# Altium footprint library ERNI THD.PcbLib: 27 footprints (part 2 of 3) (continued)
## ERNI_374047 [mm] "55 Signal Contacts in 5 Rows + 11 Ground Shield in 1 Rows, (66 Contacts in 6 Rows a,b,c,d,e,f of 11 positions), Pitch 2 mm,  Press-Fit, Ermet Hard Metric Type C Right Angle Female Connector" (continued)
  text "PCB EDGE" at 7.03,-5.3 h1.2
Mechanical 14:
  lines w0.1: 5.7,-13.95 5.7,-10.95 14.7,-10.95 ; 5.7,-12.4 12.85,-12.15 14.8,-12.15 16.35,-13.7 16.35,-13.95 -6.1,-13.95 -6.1,10.95 14.7,10.95 14.7,-12.15 ; 13.7,-10.95 13.7,10.95 ; 14.3,-10.95 14.3,10.95 ; 15.025,-13.95 15.025,-12.375 ; 8.75,-10.4 8.75,-9.6 12.75,-9.6 12.75,-10.4 8.75,-10.4 ; 8.75,9.6 12.75,9.6 12.75,10.4 8.75,10.4 8.75,9.6
  text "1" at -6.975,9.8 h1.2
  text "11" at -6.975,-10.783 h1.2
  text "f" at -6.363,11.5 h1.5
  text "e" at -4.333,11.667 h1.5
  text "d" at -2.333,11.625 h1.5
  text "c" at -0.333,11.667 h1.5
  text "b" at 1.567,11.65 h1.5
  text "a" at 3.492,11.642 h1.5
Drill Drawing:
  lines w0.1: -6.975,-8.925 -6.975,-11 5.225,-11 5.225,10.95 -6.975,10.95 -6.975,8.875
  text "diam. 0.6mm +/-0.05" at -7.1,-8.25 h1
  text "PRESS-FIT TECHNOLOGY" at -8.9,-8.275 h1
3D body "ERNI_374047.stp": height 8.15, standoff -4.1, extent -6.11,-13.95 16.35,10.95

## ERNI_374543 [mm] "Connector; DIN 41612, Type C, Thru-Hole; Rows a+b+c, 96 Position; Right Angle"
height 11
pads (98):
  round 1.7 hole 1: a1(0,0) a2(0,-2.54) a3(0,-5.08) a4(0,-7.62) a5(0,-10.16) a6(0,-12.7) a7(0,-15.24) a8(0,-17.78) a9(0,-20.32) a10(0,-22.86) a11(0,-25.4) a12(0,-27.94) a13(0,-30.48) a14(0,-33.02) a15(0,-35.56) a16(0,-38.1) a17(0,-40.64) a18(0,-43.18) a19(0,-45.72) a20(0,-48.26) a21(0,-50.8) a22(0,-53.34) a23(0,-55.88) a24(0,-58.42) a25(0,-60.96) a26(0,-63.5) a27(0,-66.04) a28(0,-68.58) a29(0,-71.12) a30(0,-73.66) a31(0,-76.2) a32(0,-78.74) b1(-2.54,0) b2(-2.54,-2.54) b3(-2.54,-5.08) b4(-2.54,-7.62) b5(-2.54,-10.16) b6(-2.54,-12.7) b7(-2.54,-15.24) b8(-2.54,-17.78) b9(-2.54,-20.32) b10(-2.54,-22.86) b11(-2.54,-25.4) b12(-2.54,-27.94) b13(-2.54,-30.48) b14(-2.54,-33.02) b15(-2.54,-35.56) b16(-2.54,-38.1) b17(-2.54,-40.64) b18(-2.54,-43.18) b19(-2.54,-45.72) b20(-2.54,-48.26) b21(-2.54,-50.8) b22(-2.54,-53.34) b23(-2.54,-55.88) b24(-2.54,-58.42) b25(-2.54,-60.96) b26(-2.54,-63.5) b27(-2.54,-66.04) b28(-2.54,-68.58) b29(-2.54,-71.12) b30(-2.54,-73.66) b31(-2.54,-76.2) b32(-2.54,-78.74) c1(-5.08,0) c2(-5.08,-2.54) c3(-5.08,-5.08) c4(-5.08,-7.62) c5(-5.08,-10.16) c6(-5.08,-12.7) c7(-5.08,-15.24) c8(-5.08,-17.78) c9(-5.08,-20.32) c10(-5.08,-22.86) c11(-5.08,-25.4) c12(-5.08,-27.94) c13(-5.08,-30.48) c14(-5.08,-33.02) c15(-5.08,-35.56) c16(-5.08,-38.1) c17(-5.08,-40.64) c18(-5.08,-43.18) c19(-5.08,-45.72) c20(-5.08,-48.26) c21(-5.08,-50.8) c22(-5.08,-53.34) c23(-5.08,-55.88) c24(-5.08,-58.42) c25(-5.08,-60.96) c26(-5.08,-63.5) c27(-5.08,-66.04) c28(-5.08,-68.58) c29(-5.08,-71.12) c30(-5.08,-73.66) c31(-5.08,-76.2) c32(-5.08,-78.74)
  round 3.5 / inner round 3.5 / far side round 5.1 hole 2.8: MTG1(2.54,5.08) MTG2(2.54,-83.82)
Top Overlay:
  lines w0.2: 0.24,-81.431 0.24,-81.67 -0.01,-81.92 -0.01,-86.37 5.29,-86.37 5.29,-83.12 ; 0.24,2.691 0.24,2.93 -0.01,3.18 -0.01,7.63 5.29,7.63 5.29,4.38 ; 0.94,-81.431 0.94,-81.67 1.1,-81.83 ccw(c1.171,-81.76) 1.214,-81.85 1.79,-81.58 1.79,-75.18 ; 0.94,2.691 0.94,2.93 1.1,3.09 cw(c1.171,3.02) 1.214,3.11 1.79,2.84 1.79,-3.56 ; 1.79,-81.22 4.193,-81.22 5.29,-83.12 ; 1.79,-74.68 1.79,-70.1 ; 1.79,-69.6 1.79,-65.02 ; 1.79,-64.52 1.79,-59.94 ; 1.79,-59.44 1.79,-54.86 ; 1.79,-54.36 1.79,-49.78 ; 1.79,-49.28 1.79,-44.7 ; 1.79,-44.2 1.79,-39.62 ; 1.79,-39.12 1.79,-34.54 ; 1.79,-34.04 1.79,-29.46 ; 1.79,-28.96 1.79,-24.38 ; 1.79,-23.88 1.79,-19.3 ; 1.79,-18.8 1.79,-14.22 ; 1.79,-13.72 1.79,-9.14 ; 1.79,-8.64 1.79,-4.071 ; 1.79,2.48 4.193,2.48 5.29,4.38 ; 5.34,-83.12 5.34,4.38 ; 5.34,-75.18 1.483,-75.18 cw(c1.05,-74.93) 1.483,-74.68 5.34,-74.68 ; 5.34,-70.1 1.483,-70.1 cw(c1.05,-69.85) 1.483,-69.6 5.34,-69.6 ; 5.34,-65.02 1.483,-65.02 cw(c1.05,-64.77) 1.483,-64.52 5.34,-64.52 ; 5.34,-59.94 1.483,-59.94 cw(c1.05,-59.69) 1.483,-59.44 5.34,-59.44 ; 5.34,-54.86 1.483,-54.86 cw(c1.05,-54.61) 1.483,-54.36 5.34,-54.36 ; 5.34,-49.78 1.483,-49.78 cw(c1.05,-49.53) 1.483,-49.28 5.34,-49.28 ; 5.34,-44.7 1.483,-44.7 cw(c1.05,-44.45) 1.483,-44.2 5.34,-44.2 ; 5.34,-39.62 1.483,-39.62 cw(c1.05,-39.37) 1.483,-39.12 5.34,-39.12 ; 5.34,-34.54 1.483,-34.54 cw(c1.05,-34.29) 1.483,-34.04 5.34,-34.04 ; 5.34,-29.46 1.483,-29.46 cw(c1.05,-29.21) 1.483,-28.96 5.34,-28.96 ; 5.34,-24.38 1.483,-24.38 cw(c1.05,-24.13) 1.483,-23.88 5.34,-23.88 ; 5.34,-19.3 1.483,-19.3 cw(c1.05,-19.05) 1.483,-18.8 5.34,-18.8 ; 5.34,-14.22 1.483,-14.22 cw(c1.05,-13.97) 1.483,-13.72 5.34,-13.72 ; 5.34,-9.14 1.483,-9.14 cw(c1.05,-8.89) 1.483,-8.64 5.34,-8.64 ; 5.34,-4.06 1.483,-4.06 cw(c1.05,-3.81) 1.483,-3.56 5.34,-3.56 ; 5.29,-83.12 12.69,-83.12 12.69,-65.8 12.09,-65.8 12.09,-61.2 12.69,-61.2 12.69,-50.56 12.09,-50.56 12.09,-45.96 12.69,-45.96 12.69,-32.78 12.09,-32.78 12.09,-28.18 12.69,-28.18 12.69,-17.54 12.09,-17.54 12.09,-12.94 12.69,-12.94 12.69,4.38 5.29,4.38 ; 0.39,-81.46 cw(c0.39,-81.06) 0.39,-80.66 0.79,-80.66 cw(c0.79,-81.06) 0.79,-81.46 0.39,-81.46 ; 0.39,1.92 cw(c0.39,2.32) 0.39,2.72 0.79,2.72 cw(c0.79,2.32) 0.79,1.92 0.39,1.92
  text "30" at -8.57,-74.31 h1.2
  text "25" at -8.57,-61.61 h1.2
  text "20" at -8.57,-48.91 h1.2
  text "15" at -8.47,-36.11 h1.2
  text "10" at -8.495,-23.51 h1.2
  text "5" at -7.445,-10.86 h1.2
  text "32" at -8.57,-79.39 h1.2
  text "1" at -7.045,-0.55 h1.2
  text "c" at -4.9,2.025 h1.2
  text "b" at -2.75,2.08 h1.2
  text "a" at -1.175,2.05 h1.2
Mechanical 8:
  drawing of 396 lines, arcs and shapes, not listed
  text "PCB" at 5.08,-41.275 h1.2
Mechanical 14:
  drawing of 276 lines, arcs and shapes, not listed
  text "a" at -1.175,2.05 h1.2
  text "b" at -2.75,2.08 h1.2
  text "c" at -4.9,2.025 h1.2
  text "30" at -8.57,-74.31 h1.2
  text "25" at -8.57,-61.61 h1.2
  text "20" at -8.57,-48.91 h1.2
  text "15" at -8.47,-36.11 h1.2
  text "10" at -8.495,-23.51 h1.2
  text "5" at -7.445,-10.86 h1.2
  text "32" at -8.57,-79.39 h1.2
  text "1" at -7.045,-0.55 h1.2
  text "c" at -4.445,-0.635 h1.2
  text "a" at 0.635,-0.635 h1.2
3D body "ERNI_374543.stp": height 9.35, standoff -2.87, extent -5.38,-86.37 12.69,7.63

## ERNI_384270 [mm] "DIN 41612, Type 2B, Thru-Hole Pressfit Terminations;  Rows a+b, 32 Positions, Performance Class 2, Lead 3 mm, Pitch 2.54mm, Right Angle Male Connector"
height 8.6
pads (34):
  round 1.7 hole 1: a1(0,0) a2(0,-2.54) a3(0,-5.08) a4(0,-7.62) a5(0,-10.16) a6(0,-12.7) a7(0,-15.24) a8(0,-17.78) a9(0,-20.32) a10(0,-22.86) a11(0,-25.4) a12(0,-27.94) a13(0,-30.48) a14(0,-33.02) a15(0,-35.56) a16(0,-38.1) b1(-2.54,0) b2(-2.54,-2.54) b3(-2.54,-5.08) b4(-2.54,-7.62) b5(-2.54,-10.16) b6(-2.54,-12.7) b7(-2.54,-15.24) b8(-2.54,-17.78) b9(-2.54,-20.32) b10(-2.54,-22.86) b11(-2.54,-25.4) b12(-2.54,-27.94) b13(-2.54,-30.48) b14(-2.54,-33.02) b15(-2.54,-35.56) b16(-2.54,-38.1)
  round 3.5 / inner round 3.5 / far side round 5.1 hole 2.8: MTG1(2.54,5.08) MTG2(2.54,-43.18)
Top Overlay:
  lines w0.2: 2.04,-40.18 -0.36,-40.18 -0.36,-46.05 7.69,-46.05 7.69,-42.5 ; 2.04,2.08 -0.36,2.08 -0.36,7.95 7.69,7.95 7.69,4.4 ; 4.32,-41.15 3.847,-40.33 2.04,-40.33 2.04,2.23 3.847,2.23 4.32,3.05 ; 5.3,-42.5 12.64,-42.5 12.64,4.4 5.3,4.4
  text "15" at -5.58,-36.235 h1.2
  text "1" at -4.255,-0.725 h1.2
  text "b" at -2.56,1.87 h1.2
  text "a" at -1.12,1.87 h1.2
  text "5" at -4.255,-10.885 h1.2
  text "10" at -5.58,-23.535 h1.2
Mechanical 8:
  drawing of 209 lines, arcs and shapes, not listed
  text "PCB EDGE" at 4.85,-22.8 h1.2
Mechanical 14:
  circle w0.1: c2.54,-43.18 r1.25
  circle w0.1: c2.54,5.08 r1.25
  lines w0.1: 2.04,-40.18 -0.36,-40.18 -0.36,-46.05 7.69,-46.05 7.69,-42.5 ; 2.04,2.08 -0.36,2.08 -0.36,7.95 7.69,7.95 7.69,4.4 ; 2.04,-40.33 2.04,2.23 3.847,2.23 5.1,4.4 12.64,4.4 12.64,-42.5 5.1,-42.5 3.847,-40.33 2.04,-40.33
  text "15" at -5.58,-36.235 h1.2
  text "10" at -5.58,-23.535 h1.2
  text "1" at -4.255,-0.725 h1.2
  text "5" at -4.255,-10.885 h1.2
Drill Drawing:
  lines w0.1: -3.9,-40.33 -3.9,2.08 1.4,2.08 1.4,-40.33 -3.9,-40.33
  text "PRESS-FIT TECHNOLOGY diam. 1mm +0.09 -0.06" at 3,-37.1 h1
3D body "ERNI_384270.stp": height 6.83, standoff -3, extent -2.79,-46.05 12.64,7.95

## ERNI_384576 [mm] "DIN 41612, Type C/2, Thru-Hole;  Rows a+b+c, 48 Positions, Lead 3.0 mm, Pitch 2.54mm, Right Angle Male Connector"
height 11
pads (50):
  round 1.7 hole 1: a1(0,0) a2(0,-2.54) a3(0,-5.08) a4(0,-7.62) a5(0,-10.16) a6(0,-12.7) a7(0,-15.24) a8(0,-17.78) a9(0,-20.32) a10(0,-22.86) a11(0,-25.4) a12(0,-27.94) a13(0,-30.48) a14(0,-33.02) a15(0,-35.56) a16(0,-38.1) b1(-2.54,0) b2(-2.54,-2.54) b3(-2.54,-5.08) b4(-2.54,-7.62) b5(-2.54,-10.16) b6(-2.54,-12.7) b7(-2.54,-15.24) b8(-2.54,-17.78) b9(-2.54,-20.32) b10(-2.54,-22.86) b11(-2.54,-25.4) b12(-2.54,-27.94) b13(-2.54,-30.48) b14(-2.54,-33.02) b15(-2.54,-35.56) b16(-2.54,-38.1) c1(-5.08,0) c2(-5.08,-2.54) c3(-5.08,-5.08) c4(-5.08,-7.62) c5(-5.08,-10.16) c6(-5.08,-12.7) c7(-5.08,-15.24) c8(-5.08,-17.78) c9(-5.08,-20.32) c10(-5.08,-22.86) c11(-5.08,-25.4) c12(-5.08,-27.94) c13(-5.08,-30.48) c14(-5.08,-33.02) c15(-5.08,-35.56) c16(-5.08,-38.1)
  round 3.5 / inner round 3.5 / far side round 5.1 hole 2.8: MTG1(2.54,5.08) MTG2(2.54,-43.18)
Top Overlay:
  lines w0.2: 0.265,-40.8 cw(c0.39,-40.42) 0.39,-40.02 0.79,-40.02 cw(c0.79,-40.42) 0.915,-40.8 ; 0.265,2.7 ccw(c0.39,2.32) 0.39,1.92 0.79,1.92 ccw(c0.79,2.32) 0.915,2.7 ; 1.787,-23.88 1.79,-19.311 ; 1.79,-40.65 4.193,-40.65 5.29,-42.55 ; 1.79,-39.78 5.24,-39.78 5.24,1.68 1.79,1.68 ; 1.79,-34.54 1.79,-41.01 1.214,-41.28 cw(c1.171,-41.19) 1.1,-41.26 0.94,-41.1 0.94,-40.8 0.24,-40.8 0.24,-41.1 -0.01,-41.35 -0.01,-45.8 5.29,-45.8 5.29,-42.55 ; 1.79,-34.04 1.79,-29.46 ; 1.79,-28.96 1.79,-24.391 ; 1.79,-18.8 1.79,-14.22 ; 1.79,-13.72 1.79,-9.151 ; 1.79,-8.64 1.79,-4.06 ; 1.79,-3.56 1.79,2.91 1.214,3.18 ccw(c1.171,3.09) 1.1,3.16 0.94,3 0.94,2.7 0.24,2.7 0.24,3.004 -0.01,3.25 -0.01,7.7 5.29,7.7 5.29,4.45 ; 1.79,2.55 4.193,2.55 5.29,4.45 ; 5.24,-34.54 1.483,-34.54 cw(c1.05,-34.29) 1.483,-34.04 5.24,-34.04 ; 5.24,-29.46 1.483,-29.46 cw(c1.05,-29.21) 1.483,-28.96 5.24,-28.96 ; 5.24,-24.38 1.483,-24.38 cw(c1.05,-24.13) 1.483,-23.88 5.24,-23.88 ; 5.24,-19.3 1.483,-19.3 cw(c1.05,-19.05) 1.483,-18.8 5.24,-18.8 ; 5.24,-14.22 1.483,-14.22 cw(c1.05,-13.97) 1.483,-13.72 5.24,-13.72 ; 5.24,-9.14 1.483,-9.14 cw(c1.05,-8.89) 1.483,-8.64 5.24,-8.64 ; 5.24,-4.06 1.483,-4.06 cw(c1.05,-3.81) 1.483,-3.56 5.24,-3.56 ; 5.29,-42.55 12.69,-42.55 12.69,-36.59 12.09,-36.59 12.09,-31.99 12.69,-31.99 12.69,-21.35 12.09,-21.35 12.09,-16.75 12.69,-16.75 12.69,-6.11 12.09,-6.11 12.09,-1.51 12.69,-1.51 12.69,4.45 5.29,4.45
Mechanical 8:
  drawing of 202 lines, arcs and shapes, not listed
Mechanical 14:
  circle w0.1: c2.54,5.08 r1.25
  circle w0.1: c2.54,-43.18 r1.25
  lines w0.1: 0,-38.1 0,0 ; 0.265,-40.8 cw(c0.39,-40.42) 0.39,-40.02 0.79,-40.02 cw(c0.79,-40.42) 0.915,-40.8 ; 0.265,2.7 ccw(c0.39,2.32) 0.39,1.92 0.79,1.92 ccw(c0.79,2.32) 0.915,2.7 ; 1.787,-23.88 1.79,-19.311 ; 1.79,-40.65 4.193,-40.65 5.29,-42.55 ; 1.79,-39.78 5.24,-39.78 5.24,1.68 1.79,1.68 ; 1.79,-38.55 -5.38,-38.55 -5.38,-37.65 1.79,-37.65 ; 1.79,-36.01 -5.38,-36.01 -5.38,-35.11 1.79,-35.11 ; 1.79,-34.54 1.79,-41.01 1.214,-41.28 cw(c1.171,-41.19) 1.1,-41.26 0.94,-41.1 0.94,-40.8 0.24,-40.8 0.24,-41.1 -0.01,-41.35 -0.01,-45.8 5.29,-45.8 5.29,-42.55 ; 1.79,-34.04 1.79,-29.46 ; 1.79,-33.47 -5.38,-33.47 -5.38,-32.57 1.79,-32.57 ; 1.79,-30.93 -5.38,-30.93 -5.38,-30.03 1.79,-30.03 ; 1.79,-28.96 1.79,-24.391 ; 1.79,-28.39 -5.38,-28.39 -5.38,-27.49 1.79,-27.49 ; 1.79,-25.85 -5.38,-25.85 -5.38,-24.95 1.79,-24.95 ; 1.79,-23.31 -5.38,-23.31 -5.38,-22.41 1.79,-22.41 ; 1.79,-20.77 -5.38,-20.77 -5.38,-19.87 1.79,-19.87 ; 1.79,-18.8 1.79,-14.22 ; 1.79,-18.23 -5.38,-18.23 -5.38,-17.33 1.79,-17.33 ; 1.79,-15.69 -5.38,-15.69 -5.38,-14.79 1.79,-14.79 ; 1.79,-13.72 1.79,-9.151 ; 1.79,-13.15 -5.38,-13.15 -5.38,-12.25 1.79,-12.25 ; 1.79,-10.61 -5.38,-10.61 -5.38,-9.71 1.79,-9.71 ; 1.79,-8.64 1.79,-4.06 ; 1.79,-8.07 -5.38,-8.07 -5.38,-7.17 1.79,-7.17 ; 1.79,-5.53 -5.38,-5.53 -5.38,-4.63 1.79,-4.63 ; 1.79,-3.56 1.79,2.91 1.214,3.18 ccw(c1.171,3.09) 1.1,3.16 0.94,3 0.94,2.7 0.24,2.7 0.24,3.004 -0.01,3.25 -0.01,7.7 5.29,7.7 5.29,4.45 ; 1.79,-2.99 -5.38,-2.99 -5.38,-2.09 1.79,-2.09 ; 1.79,-0.45 -5.38,-0.45 -5.38,0.45 1.79,0.45 ; 1.79,2.55 4.193,2.55 5.29,4.45 ; 5.24,-34.54 1.483,-34.54 cw(c1.05,-34.29) 1.483,-34.04 5.24,-34.04 ; 5.24,-29.46 1.483,-29.46 cw(c1.05,-29.21) 1.483,-28.96 5.24,-28.96 ; 5.24,-24.38 1.483,-24.38 cw(c1.05,-24.13) 1.483,-23.88 5.24,-23.88 ; 5.24,-19.3 1.483,-19.3 cw(c1.05,-19.05) 1.483,-18.8 5.24,-18.8 ; 5.24,-14.22 1.483,-14.22 cw(c1.05,-13.97) 1.483,-13.72 5.24,-13.72 ; 5.24,-9.14 1.483,-9.14 cw(c1.05,-8.89) 1.483,-8.64 5.24,-8.64 ; 5.24,-4.06 1.483,-4.06 cw(c1.05,-3.81) 1.483,-3.56 5.24,-3.56 ; 5.29,-42.55 12.69,-42.55 12.69,-36.59 12.09,-36.59 12.09,-31.99 12.69,-31.99 12.69,-21.35 12.09,-21.35 12.09,-16.75 12.69,-16.75 12.69,-6.11 12.09,-6.11 12.09,-1.51 12.69,-1.51 12.69,4.45 5.29,4.45
3D body "ERNI_384576.stp": height 9.35, standoff -2.87, extent -5.38,-45.8 12.69,7.7

## ERNI_454530 [mm] "120 Contacts (10x3 Pairs Signal Contacts + 6x10 Ground Contacts), Pitch 2.5mm,  Press-Fit, Right Angle ERmet ZDplus High Speed Differential Hard Metric Female Connector"
height 16.9
pads (120):
  round 0.95 hole 0.45: a1(5.7,11.238) a2(5.7,8.738) a3(5.7,6.238) a4(5.7,3.738) a5(5.7,1.238) a6(5.7,-1.262) a7(5.7,-3.762) a8(5.7,-6.262) a9(5.7,-8.762) a10(5.7,-11.262) b1(4.5,11.238) b2(4.5,8.738) b3(4.5,6.238) b4(4.5,3.738) b5(4.5,1.238) b6(4.5,-1.262) b7(4.5,-3.762) b8(4.5,-6.262) b9(4.5,-8.762) b10(4.5,-11.262) c1(1.2,11.238) c2(1.2,8.738) c3(1.2,6.238) c4(1.2,3.738) c5(1.2,1.238) c6(1.2,-1.262) c7(1.2,-3.762) c8(1.2,-6.262) c9(1.2,-8.762) c10(1.2,-11.262) d1(0,11.238) d2(0,8.738) d3(0,6.238) d4(0,3.738) d5(0,1.238) d6(0,-1.262) d7(0,-3.762) d8(0,-6.262) d9(0,-8.762) d10(0,-11.262) e1(-3.3,11.238) e2(-3.3,8.738) e3(-3.3,6.238) e4(-3.3,3.738) e5(-3.3,1.238) e6(-3.3,-1.262) e7(-3.3,-3.762) e8(-3.3,-6.262) e9(-3.3,-8.762) e10(-3.3,-11.262) f1(-4.5,11.238) f2(-4.5,8.738) f3(-4.5,6.238) f4(-4.5,3.738) f5(-4.5,1.238) f6(-4.5,-1.262) f7(-4.5,-3.762) f8(-4.5,-6.262) f9(-4.5,-8.762) f10(-4.5,-11.262) Ga1(6.8,10.198) Ga2(6.8,7.698) Ga3(6.8,5.198) Ga4(6.8,2.698) Ga5(6.8,0.198) Ga6(6.8,-2.302) Ga7(6.8,-4.802) Ga8(6.8,-7.302) Ga9(6.8,-9.803) Ga10(6.8,-12.303) Gb1(3.3,11.238) Gb2(3.3,8.738) Gb3(3.3,6.238) Gb4(3.3,3.738) Gb5(3.3,1.238) Gb6(3.3,-1.262) Gb7(3.3,-3.762) Gb8(3.3,-6.262) Gb9(3.3,-8.762) Gb10(3.3,-11.262) Gc1(2.4,11.238) Gc2(2.4,8.738) Gc3(2.4,6.238) Gc4(2.4,3.738) Gc5(2.4,1.238) Gc6(2.4,-1.262) Gc7(2.4,-3.762) Gc8(2.4,-6.262) Gc9(2.4,-8.762) Gc10(2.4,-11.262) Gd1(-1.2,11.238) Gd2(-1.2,8.738) Gd3(-1.2,6.238) Gd4(-1.2,3.738) Gd5(-1.2,1.238) Gd6(-1.2,-1.262) Gd7(-1.2,-3.762) Gd8(-1.2,-6.262) Gd9(-1.2,-8.762) Gd10(-1.2,-11.262) Ge1(-2.1,11.238) Ge2(-2.1,8.738) Ge3(-2.1,6.238) Ge4(-2.1,3.738) Ge5(-2.1,1.238) Ge6(-2.1,-1.262) Ge7(-2.1,-3.762) Ge8(-2.1,-6.262) Ge9(-2.1,-8.762) Ge10(-2.1,-11.262) Gf1(-5.7,11.238) Gf2(-5.7,8.738) Gf3(-5.7,6.238) Gf4(-5.7,3.738) Gf5(-5.7,1.238) Gf6(-5.7,-1.262) Gf7(-5.7,-3.762) Gf8(-5.7,-6.262) Gf9(-5.7,-8.762) Gf10(-5.7,-11.262)
Top Overlay:
  lines w0.2: -6.2,-11.919 -6.2,-12.962 6.305,-12.962 ; -6.2,-10.606 -6.2,-9.419 ; -6.2,-8.106 -6.2,-6.919 ; -6.2,-5.606 -6.2,-4.419 ; -6.2,-3.106 -6.2,-1.919 ; -6.2,-0.606 -6.2,0.581 ; -6.2,1.894 -6.2,3.081 ; -6.2,4.394 -6.2,5.581 ; -6.2,6.894 -6.2,8.081 ; -6.2,9.394 -6.2,10.581 ; -6.2,11.894 -6.2,11.987 -6.044,11.987 ; -5.356,11.987 -4.844,11.987 ; -4.156,11.987 -3.644,11.987 ; -2.956,11.987 -2.444,11.987 ; -0.856,11.987 -0.344,11.987 ; 0.344,11.987 0.856,11.987 ; 1.544,11.987 2.056,11.987 ; 3.644,11.987 4.156,11.987 ; 4.844,11.987 5.356,11.987 ; 6.044,11.987 17.2,11.987 17.2,6.488 ; 7.295,-12.962 17.2,-12.962 17.2,-7.512 ; 14.402,-6.592 15.7,-6.592 ; 14.402,-4.593 15.7,-4.593 ; 14.402,-4.094 15.7,-4.092 15.7,-7.093 14.402,-7.093 14.402,-4.092 ; 14.402,3.407 15.7,3.407 ; 14.402,5.407 15.7,5.407 ; 14.402,5.906 15.7,5.907 15.7,2.907 14.402,2.907 14.402,5.908 ; 17.2,-10.012 18.2,-9.012 18.2,-7.013 17.95,-6.763 ; 17.2,8.988 18.2,7.987 18.2,5.987 17.95,5.737 ; 17.2,-7.512 18.2,-6.512 18.2,-4.513 17.2,-3.512 ; 17.2,-7.512 15.2,-7.512 12.9,-7.392 12.9,-3.633 15.2,-3.512 17.2,-3.512 ; 17.2,-3.512 17.2,2.488 ; 17.2,2.488 15.2,2.488 12.9,2.608 12.9,6.367 15.2,6.488 17.2,6.488 ; 17.2,2.488 18.2,3.487 18.2,5.487 17.2,6.488 ; 16.7,3.988 16.7,4.988 17.4,4.988 17.4,3.988 16.7,3.988
  text "a" at 8.325,-12.2 h1.2
  text "1" at -7.35,10.675 h1.2
  text "10" at -8.75,-11.875 h1.2
Mechanical 8:
  drawing of 488 lines, arcs and shapes, not listed
  text "PCB EDGE" at 9.23,-4.975 h1.2
  text "Ga" at 7.107,8.299 h1
  text "a" at 6.007,9.713 h1
  text "b" at 4.807,9.713 h1
  text "Gb" at 3.607,9.339 h1
  text "Gc" at 2.707,9.407 h1
  text "c" at 1.507,9.8 h1
  text "d" at 0.307,9.75 h1
  text "Gd" at -0.893,9.357 h1
  text "Ge" at -1.793,9.357 h1
  text "e" at -2.993,9.747 h1
  text "f" at -3.865,9.781 h1
  text "Gf" at -5.065,9.407 h1
  text "10" at 7.984,-10.518 h1.2
  text "1" at 7.984,11.562 h1.2
Mechanical 14:
  lines w0.1: -3,-12.962 -3,11.987 ; -2.7,-12.962 -2.7,11.987 ; 7.3,-12.962 7.3,11.987 ; 14.402,-6.592 15.7,-6.592 ; 14.402,-4.593 15.7,-4.593 ; 14.402,-4.094 15.7,-4.092 15.7,-7.093 14.402,-7.093 14.402,-4.092 ; 14.402,3.407 15.7,3.407 ; 14.402,5.407 15.7,5.407 ; 14.402,5.906 15.7,5.907 15.7,2.907 14.402,2.907 14.402,5.908 ; 17.2,-10.012 18.2,-9.012 18.2,-7.013 17.95,-6.763 ; 17.2,8.988 18.2,7.987 18.2,5.987 17.95,5.737 ; 17.2,-7.512 17.2,-12.962 -6.2,-12.962 -6.2,11.987 17.2,11.987 17.2,6.488 ; 17.2,-7.512 18.2,-6.512 18.2,-4.513 17.2,-3.512 ; 17.2,-7.512 15.2,-7.512 12.9,-7.392 12.9,-3.633 15.2,-3.512 17.2,-3.512 ; 17.2,-3.512 17.2,2.488 ; 17.2,2.488 15.2,2.488 12.9,2.608 12.9,6.367 15.2,6.488 17.2,6.488 ; 17.2,2.488 18.2,3.487 18.2,5.487 17.2,6.488 ; 16.7,3.988 16.7,4.988 17.4,4.988 17.4,3.988 16.7,3.988
  text "a" at 8.325,-12.2 h1.2
  text "1" at -7.35,10.675 h1.2
  text "10" at -8.75,-11.875 h1.2
Drill Drawing:
  lines w0.1: -6.2,-12.962 7.3,-12.962 7.3,11.987 -6.2,11.987 -6.2,-12.962
  text "PRESS-FIT TECHNOLOGY" at 8.865,-9.425 h1
  text "diam. 0.45mm +0.06/-0.04" at 10.475,-11.225 h1
3D body "ERNI_454530.stp": height 12.2, standoff -5.2, extent -6.2,-12.962 18.2,11.988

## ERNI_533410 [mm] "Eurocard DIN 41612, Type C, 32 Position, Rows a+c, Performance level 2, Male, Lead 3.0 mm, Pitch 2.54 mm"
height 11
pads (34):
  round 1.7 hole 1: a2(0,0) a4(0,-5.08) a6(0,-10.16) a8(0,-15.24) a10(0,-20.32) a12(0,-25.4) a14(0,-30.48) a16(0,-35.56) a18(0,-40.64) a20(0,-45.72) a22(0,-50.8) a24(0,-55.88) a26(0,-60.96) a28(0,-66.04) a30(0,-71.12) a32(0,-76.2) c2(-5.08,0) c4(-5.08,-5.08) c6(-5.08,-10.16) c8(-5.08,-15.24) c10(-5.08,-20.32) c12(-5.08,-25.4) c14(-5.08,-30.48) c16(-5.08,-35.56) c18(-5.08,-40.64) c20(-5.08,-45.72) c22(-5.08,-50.8) c24(-5.08,-55.88) c26(-5.08,-60.96) c28(-5.08,-66.04) c30(-5.08,-71.12) c32(-5.08,-76.2)
  round 3.5 / inner round 3.5 / far side round 5.1 hole 2.8: MTG1(2.54,7.62) MTG2(2.54,-81.28)
Top Overlay:
  drawing of 163 lines, arcs and shapes, not listed
  text "30" at -8.22,-71.695 h1.2
  text "28" at -8.22,-66.615 h1.2
  text "20" at -8.22,-46.295 h1.2
  text "10" at -8.22,-20.895 h1.2
  text "32" at -8.22,-76.775 h1.2
  text "a" at 0.635,1.905 h1.2
  text "c" at -4.445,1.905 h1.2
  text "26" at -8.22,-61.535 h1.2
  text "24" at -8.22,-56.455 h1.2
  text "22" at -8.22,-51.375 h1.2
  text "18" at -8.22,-41.215 h1.2
  text "16" at -8.22,-36.135 h1.2
  text "14" at -8.22,-31.055 h1.2
  text "12" at -8.22,-25.975 h1.2
  text "8" at -8.22,-15.815 h1.2
  text "6" at -8.12,-10.735 h1.2
  text "4" at -8.12,-5.655 h1.2
  text "2" at -8.12,-0.575 h1.2
Mechanical 8:
  lines w0.1: -5.08,-36.83 12.64,-36.83
  text "PCB" at 5.08,-38.735 h1.2
Mechanical 14:
  drawing of 163 lines, arcs and shapes, not listed
  text "2" at -8.12,-0.575 h1.2
  text "4" at -8.12,-5.655 h1.2
  text "6" at -8.12,-10.735 h1.2
  text "8" at -8.22,-15.815 h1.2
  text "12" at -8.22,-25.975 h1.2
  text "14" at -8.22,-31.055 h1.2
  text "16" at -8.22,-36.135 h1.2
  text "18" at -8.22,-41.215 h1.2
  text "22" at -8.22,-51.375 h1.2
  text "24" at -8.22,-56.455 h1.2
  text "26" at -8.22,-61.535 h1.2
  text "32" at -8.22,-76.775 h1.2
  text "10" at -8.22,-20.895 h1.2
  text "20" at -8.22,-46.295 h1.2
  text "28" at -8.22,-66.615 h1.2
  text "30" at -8.22,-71.695 h1.2
  text "c" at -4.445,1.905 h1.2
  text "a" at 0.635,1.905 h1.2
  text "PCB" at 6.05,-40.1 h1.2
3D body "ERNI_533410.stp": height 9.4, standoff -3, extent -5.38,-83.83 12.64,10.17

## ERNI_593814 [mm] "DIN 41612, Type M, 42 Contacts + 6 Spares  Positions for Specials Contacts, Right Angle Male Connector, Pitch 2.54 mm"
height 11
pads (44):
  round 1.5 hole 1: a10(0,-22.86) a11(0,-25.4) a12(0,-27.94) a13(0,-30.48) a14(0,-33.02) a15(0,-35.56) a16(0,-38.1) a17(0,-40.64) a18(0,-43.18) a19(0,-45.72) a20(0,-48.26) a21(0,-50.8) a22(0,-53.34) a23(0,-55.88) b10(-2.54,-22.86) b11(-2.54,-25.4) b12(-2.54,-27.94) b13(-2.54,-30.48) b14(-2.54,-33.02) b15(-2.54,-35.56) b16(-2.54,-38.1) b17(-2.54,-40.64) b18(-2.54,-43.18) b19(-2.54,-45.72) b20(-2.54,-48.26) b21(-2.54,-50.8) b22(-2.54,-53.34) b23(-2.54,-55.88) c10(-5.08,-22.86) c11(-5.08,-25.4) c12(-5.08,-27.94) c13(-5.08,-30.48) c14(-5.08,-33.02) c15(-5.08,-35.56) c16(-5.08,-38.1) c17(-5.08,-40.64) c18(-5.08,-43.18) c19(-5.08,-45.72) c20(-5.08,-48.26) c21(-5.08,-50.8) c22(-5.08,-53.34) c23(-5.08,-55.88)
  round 3.5 / inner round 3.5 / far side round 5.1 hole 2.8: MTG1(2.54,5.08) MTG2(2.54,-83.82)
Top Overlay:
  lines w0.2: -1.965,0.46 -1.96,2.63 1.5,2.63 ; -1.963,-73.2 -1.96,-71.58 ; -1.963,-65.58 -1.96,-63.96 ; -1.963,-14.78 -1.96,-13.16 ; -1.963,-7.16 -1.96,-5.54 ; -1.955,-79.2 -1.96,-81.37 1.5,-81.37 ; 0.54,-85.857 0.54,-86.37 7.24,-86.37 7.24,-83.17 12.74,-83.17 12.74,4.43 7.24,4.43 7.24,7.63 0.54,7.63 0.54,7.117 ; 0.54,-81.883 0.54,-81.37 ; 0.54,2.63 0.54,3.143 ; 1.29,-57.94 1.29,-20.8 ; 3.5,-81.37 4.04,-81.37 5.54,-83.87 5.54,-86.37 ; 3.5,2.63 4.04,2.63 5.54,5.13 5.64,7.63
  text "20" at -8.12,-48.935 h1.2
  text "15" at -8.12,-36.235 h1.2
  text "10" at -8.12,-23.535 h1.2
  text "a" at 0,3.302 h1.2
  text "b" at -2.04,3.22 h1.2
  text "c" at -4.58,3.22 h1.2
Mechanical 8:
  drawing of 314 lines, arcs and shapes, not listed
  text "PCB EDGE" at 4.98,-43.525 h1.2
Mechanical 14:
  lines w0.1: 0.54,-81.37 0.54,-86.37 7.24,-86.37 7.24,-83.17 12.74,-83.17 12.74,4.43 7.24,4.43 7.24,7.63 0.54,7.63 0.54,2.63 ; 1.29,-56.23 -5.38,-56.23 -5.38,-55.53 1.295,-55.53 ; 1.29,-53.69 -5.38,-53.69 -5.38,-52.99 1.295,-52.99 ; 1.29,-51.15 -5.38,-51.15 -5.38,-50.45 1.295,-50.45 ; 1.29,-48.61 -5.38,-48.61 -5.38,-47.91 1.295,-47.91 ; 1.29,-46.07 -5.38,-46.07 -5.38,-45.37 1.295,-45.37 ; 1.29,-43.53 -5.38,-43.53 -5.38,-42.83 1.295,-42.83 ; 1.29,-40.99 -5.38,-40.99 -5.38,-40.29 1.295,-40.29 ; 1.29,-38.45 -5.38,-38.45 -5.38,-37.75 1.295,-37.75 ; 1.29,-35.91 -5.38,-35.91 -5.38,-35.21 1.295,-35.21 ; 1.29,-33.37 -5.38,-33.37 -5.38,-32.67 1.295,-32.67 ; 1.29,-30.83 -5.38,-30.83 -5.38,-30.13 1.295,-30.13 ; 1.29,-28.29 -5.38,-28.29 -5.38,-27.59 1.295,-27.59 ; 1.29,-25.75 -5.38,-25.75 -5.38,-25.05 1.295,-25.05 ; 1.29,-23.21 -5.38,-23.21 -5.38,-22.51 1.295,-22.51 ; 5.54,-86.37 5.54,-83.87 4.04,-81.37 -1.96,-81.37 -1.96,-57.94 1.29,-57.94 1.29,-20.8 -1.96,-20.8 -1.96,2.63 4.04,2.63 5.54,5.13 5.64,7.63
  text "20" at -8.12,-48.935 h1.2
  text "10" at -8.12,-23.535 h1.2
3D body "ERNI_593814.stp": height 9.4, standoff -3, extent -5.38,-86.37 12.74,7.63

## ERNI_594211 [mm] "Special Contacts for DIN Connectors, Coax Right Angle Female"
height 6
pads (5):
  round 1.7 hole 1: 1(0,0) 2(-2.54,-2.54) 2(-2.54,2.54) 2(2.54,-2.54) 2(2.54,2.54)
Top Overlay:
  lines w0.2: -3,-1.596 -3,1.596 ; -1.596,-3 1.596,-3 ; -1.596,3 1.596,3 ; 3,-1.596 3,1.596 ; 3.573,-2.35 3.86,-2.35 ; 3.573,2.35 3.86,2.35 ; 4.86,-2.35 5.2,-2.35 5.2,-1.5 ; 4.86,2.35 5.2,2.35 5.2,1.5 ; 5.2,-2.035 6.86,-2.035 ; 5.2,-0.5 5.2,0.5 ; 5.2,2.035 6.86,2.035 ; 7.86,-2.035 8.86,-2.035 ; 7.86,2.035 8.86,2.035 ; 9.86,-2.035 10.86,-2.035 ; 9.86,2.035 10.86,2.035 ; 11.86,-2.035 12.86,-2.035 ; 11.86,2.035 12.86,2.035 ; 13.86,-2.035 14.86,-2.035 ; 13.86,2.035 14.86,2.035 14.86,1.5 ; 14.86,-2.035 14.86,-1.5 14.86,-2.035 ; 14.86,-0.5 14.86,0.5 14.86,-0.5
Mechanical 8:
  lines w0.1: -3.54,-2.54 -2.54,-2.54 ; -3.54,2.54 -2.54,2.54 ; -2.54,-3.54 -2.54,-2.54 ; -2.54,-1.54 -2.54,-2.54 ; -2.54,1.54 -2.54,2.54 ; -2.54,3.54 -2.54,2.54 ; -1.54,-2.54 -2.54,-2.54 ; -1.54,2.54 -2.54,2.54 ; -1,0 0,0 ; 0,-1 0,0 ; 0,1 0,0 ; 1,0 0,0 ; 1.54,-2.54 2.54,-2.54 ; 1.54,2.54 2.54,2.54 ; 2.54,-3.54 2.54,-2.54 ; 2.54,-1.54 2.54,-2.54 ; 2.54,1.54 2.54,2.54 ; 2.54,3.54 2.54,2.54 ; 3.54,-2.54 2.54,-2.54 ; 3.54,2.54 2.54,2.54
Mechanical 14:
  lines w0.1: 3,-2.35 5.2,-2.35 5.2,2.35 3,2.35 ; 5.2,-2.035 14.86,-2.035 14.86,2.035 5.2,2.035 ; -3,-3 3,-3 3,3 -3,3 -3,-3
3D body "ERNI_594211.stp": height 6.85, standoff -2.75, extent -3,-3 14.86,3